# Altium footprint library Ultrascale_PcbLib.PcbLib: 132 footprints (part 4 of 9)
Each footprint in its own frame and in the unit in brackets; x right, y up, seen from the top. Pads: shape width x height; smd on the part's side, far side on the other; paste and mask are expansions set on the pad; w line width, h text height; cw(c..) or ccw(c..) is an arc to the next point about the centre after c.
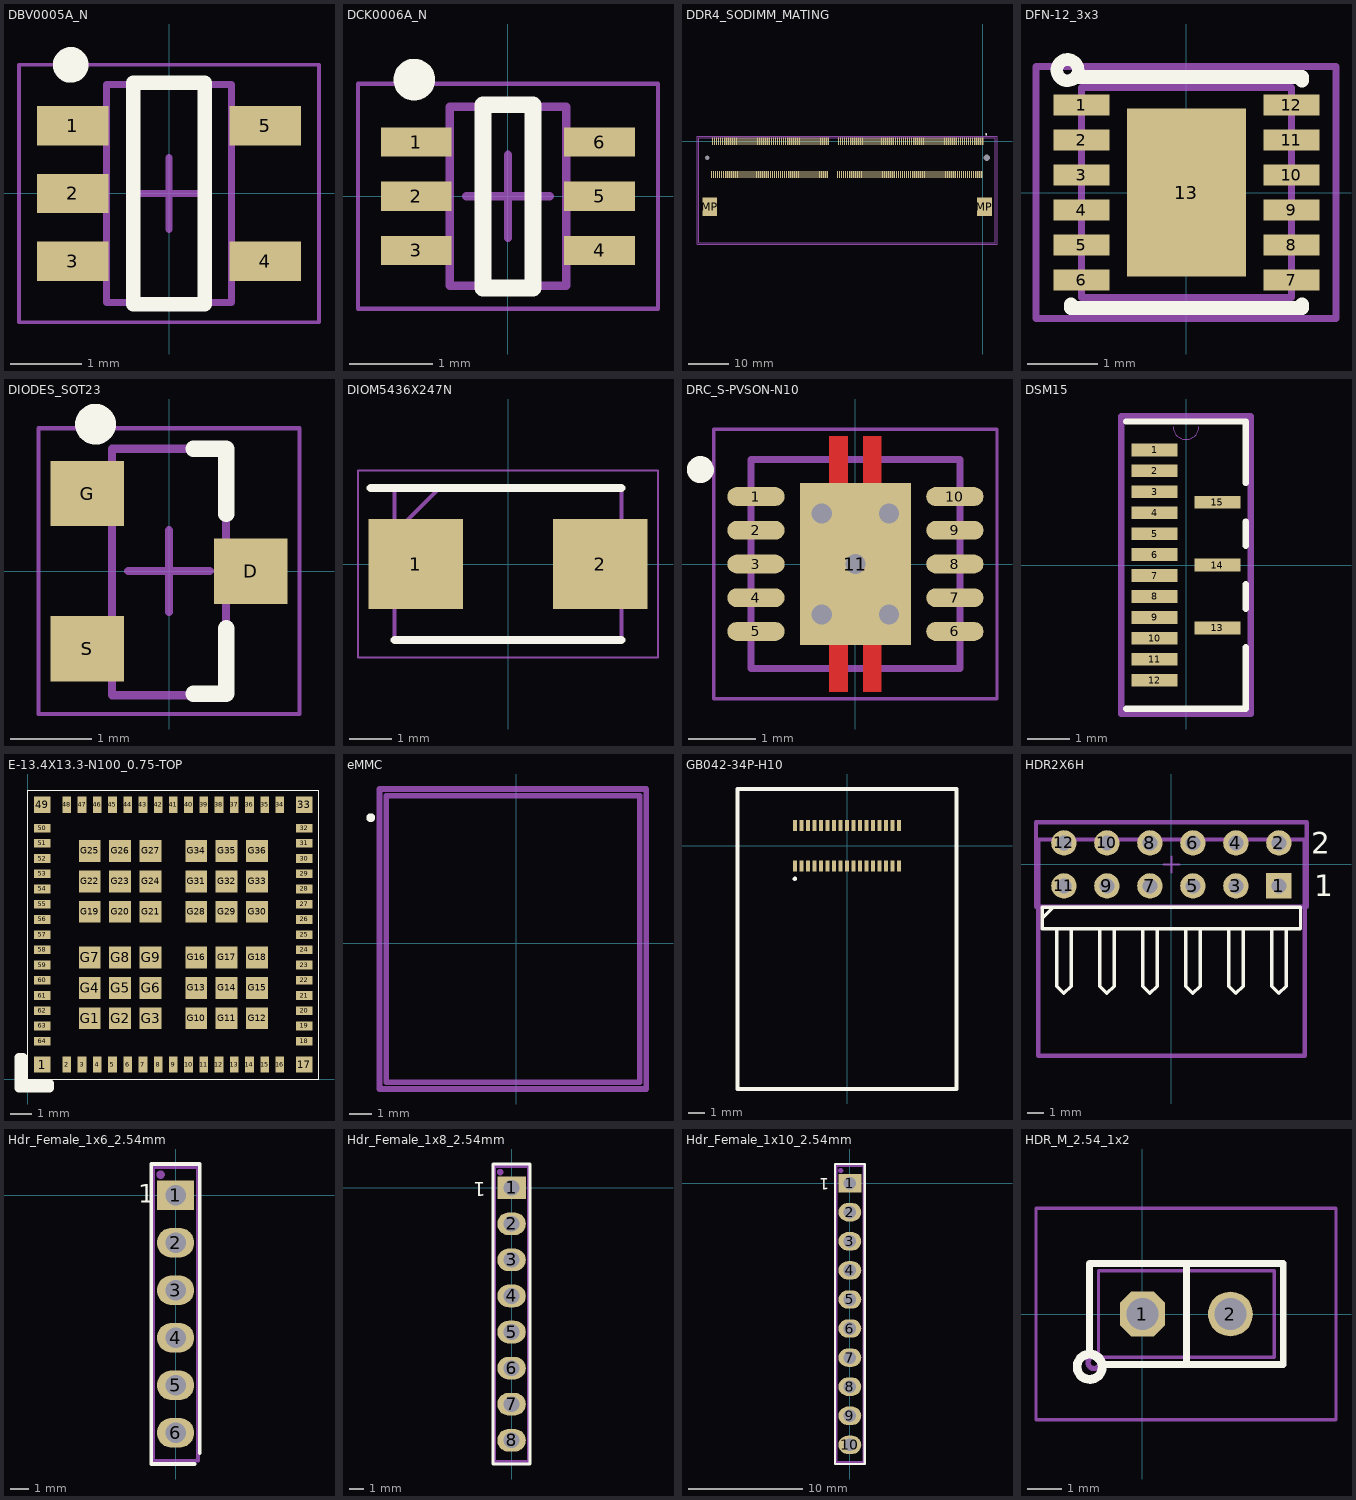
[diagram p3: the footprints below, top view; thin cyan lines are the x and y axes]

## DBV0005A_N [mm] "SOT23, 5-Leads, Body 3.05x1.75mm, Pitch 0.95mm, IPC Medium Density"
height 1.45
pads (5):
  rect 1x0.55 smd: 1(-1.35,0.95) 2(-1.35,0) 3(-1.35,-0.95) 4(1.35,-0.95) 5(1.35,0.95)
Top Overlay:
  circle w0.25: c-1.375,1.8 r0.125
  lines w0.2: -0.5,-1.55 0.5,-1.55 0.5,1.55 -0.5,1.55 -0.5,-1.55
Mechanical 13:
  lines w0.1: -0.875,-1.525 -0.875,1.525 0.875,1.525 0.875,-1.525 -0.875,-1.525
Mechanical 15:
  lines w0.05: -2.1,-1.8 -2.1,1.8 2.1,1.8 2.1,-1.8 -2.1,-1.8
  lines w0.1: -0.5,0 0.5,0 ; 0,-0.5 0,0.5
3D body "DBV0005AaksMF05A.stp": height 1.45, standoff -0.01, extent -1.422,-1.461 1.422,1.46

## DCK0006A_N [mm] "SOT23, 6-Leads, Body 2.15x1.4mm, Pitch 0.65mm, IPC Medium Density"
height 1.1
pads (6):
  rect 0.85x0.35 smd mask+0.05: 1(-1.1,0.65) 2(-1.1,0) 3(-1.1,-0.65) 4(1.1,-0.65) 5(1.1,0) 6(1.1,0.65)
Top Overlay:
  circle w0.25: c-1.125,1.4 r0.125
  lines w0.2: -0.3,-1.1 -0.3,1.1 0.3,1.1 0.3,-1.1 -0.3,-1.1
Mechanical 13:
  lines w0.1: -0.7,-1.075 0.7,-1.075 0.7,1.075 -0.7,1.075 -0.7,-1.075
Mechanical 15:
  lines w0.05: -1.8,-1.35 1.8,-1.35 1.8,1.35 -1.8,1.35 -1.8,-1.35
  lines w0.1: -0.5,0 0.5,0 ; 0,-0.5 0,0.5
3D body "DCK0006AakaMAA06.stp": height 1.1, standoff -0.01, extent -1.14,-1 1.14,1

## DDR4_SODIMM_MATING [mm] "REF: TE 2309409-4"
height 5.35
pads (264):
  rect 0.3x1.75 smd paste+0.05 mask+0.05: 1(0,0) 2(-0.25,-8.2) 3(-0.5,0) 4(-0.75,-8.2) 5(-1,0) 6(-1.25,-8.2) 7(-1.5,0) 8(-1.75,-8.2) 9(-2,0) 10(-2.25,-8.2) 11(-2.5,0) 12(-2.75,-8.2) 13(-3,0) 14(-3.25,-8.2) 15(-3.5,0) 16(-3.75,-8.2) 17(-4,0) 18(-4.25,-8.2) 19(-4.5,0) 20(-4.75,-8.2) 21(-5,0) 22(-5.25,-8.2) 23(-5.5,0) 24(-5.75,-8.2) 25(-6,0) 26(-6.25,-8.2) 27(-6.5,0) 28(-6.75,-8.2) 29(-7,0) 30(-7.25,-8.2) 31(-7.5,0) 32(-7.75,-8.2) 33(-8,0) 34(-8.25,-8.2) 35(-8.5,0) 36(-8.75,-8.2) 37(-9,0) 38(-9.25,-8.2) 39(-9.5,0) 40(-9.75,-8.2) 41(-10,0) 42(-10.25,-8.2) 43(-10.5,0) 44(-10.75,-8.2) 45(-11,0) 46(-11.25,-8.2) 47(-11.5,0) 48(-11.75,-8.2) 49(-12,0) 50(-12.25,-8.2) 51(-12.5,0) 52(-12.75,-8.2) 53(-13,0) 54(-13.25,-8.2) 55(-13.5,0) 56(-13.75,-8.2) 57(-14,0) 58(-14.25,-8.2) 59(-14.5,0) 60(-14.75,-8.2) 61(-15,0) 62(-15.25,-8.2) 63(-15.5,0) 64(-15.75,-8.2) 65(-16,0) 66(-16.25,-8.2) 67(-16.5,0) 68(-16.75,-8.2) 69(-17,0) 70(-17.25,-8.2) 71(-17.5,0) 72(-17.75,-8.2) 73(-18,0) 74(-18.25,-8.2) 75(-18.5,0) 76(-18.75,-8.2) 77(-19,0) 78(-19.25,-8.2) 79(-19.5,0) 80(-19.75,-8.2) 81(-20,0) 82(-20.25,-8.2) 83(-20.5,0) 84(-20.75,-8.2) 85(-21,0) 86(-21.25,-8.2) 87(-21.5,0) 88(-21.75,-8.2) 89(-22,0) 90(-22.25,-8.2) 91(-22.5,0) 92(-22.75,-8.2) 93(-23,0) 94(-23.25,-8.2) 95(-23.5,0) 96(-23.75,-8.2) 97(-24,0) 98(-24.25,-8.2) 99(-24.5,0) 100(-24.75,-8.2) 101(-25,0) 102(-25.25,-8.2) 103(-25.5,0) 104(-25.75,-8.2) 105(-26,0) 106(-26.25,-8.2) 107(-26.5,0) 108(-26.75,-8.2) 109(-27,0) 110(-27.25,-8.2) 111(-27.5,0) 112(-27.75,-8.2) 113(-28,0) 114(-28.25,-8.2) 115(-28.5,0) 116(-28.75,-8.2) 117(-29,0) 118(-29.25,-8.2) 119(-29.5,0) 120(-29.75,-8.2) 121(-30,0) 122(-30.25,-8.2) 123(-30.5,0) 124(-30.75,-8.2) 125(-31,0) 126(-31.25,-8.2) 127(-31.5,0) 128(-31.75,-8.2) 129(-32,0) 130(-32.25,-8.2) 131(-32.5,0) 132(-32.75,-8.2) 133(-33,0) 134(-33.25,-8.2) 135(-33.5,0) 136(-33.75,-8.2) 137(-34,0) 138(-34.25,-8.2) 139(-34.5,0) 140(-34.75,-8.2) 141(-35,0) 142(-35.25,-8.2) 143(-35.5,0) 144(-35.75,-8.2) 145(-38,0) 146(-38.25,-8.2) 147(-38.5,0) 148(-38.75,-8.2) 149(-39,0) 150(-39.25,-8.2) 151(-39.5,0) 152(-39.75,-8.2) 153(-40,0) 154(-40.25,-8.2) 155(-40.5,0) 156(-40.75,-8.2) 157(-41,0) 158(-41.25,-8.2) 159(-41.5,0) 160(-41.75,-8.2) 161(-42,0) 162(-42.25,-8.2) 163(-42.5,0) 164(-42.75,-8.2) 165(-43,0) 166(-43.25,-8.2) 167(-43.5,0) 168(-43.75,-8.2) 169(-44,0) 170(-44.25,-8.2) 171(-44.5,0) 172(-44.75,-8.2) 173(-45,0) 174(-45.25,-8.2) 175(-45.5,0) 176(-45.75,-8.2) 177(-46,0) 178(-46.25,-8.2) 179(-46.5,0) 180(-46.75,-8.2) 181(-47,0) 182(-47.25,-8.2) 183(-47.5,0) 184(-47.75,-8.2) 185(-48,0) 186(-48.25,-8.2) 187(-48.5,0) 188(-48.75,-8.2) 189(-49,0) 190(-49.25,-8.2) 191(-49.5,0) 192(-49.75,-8.2) 193(-50,0) 194(-50.25,-8.2) 195(-50.5,0) 196(-50.75,-8.2) 197(-51,0) 198(-51.25,-8.2) 199(-51.5,0) 200(-51.75,-8.2) 201(-52,0) 202(-52.25,-8.2) 203(-52.5,0) 204(-52.75,-8.2) 205(-53,0) 206(-53.25,-8.2) 207(-53.5,0) 208(-53.75,-8.2) 209(-54,0) 210(-54.25,-8.2) 211(-54.5,0) 212(-54.75,-8.2) 213(-55,0) 214(-55.25,-8.2) 215(-55.5,0) 216(-55.75,-8.2) 217(-56,0) 218(-56.25,-8.2) 219(-56.5,0) 220(-56.75,-8.2) 221(-57,0) 222(-57.25,-8.2) 223(-57.5,0) 224(-57.75,-8.2) 225(-58,0) 226(-58.25,-8.2) 227(-58.5,0) 228(-58.75,-8.2) 229(-59,0) 230(-59.25,-8.2) 231(-59.5,0) 232(-59.75,-8.2) 233(-60,0) 234(-60.25,-8.2) 235(-60.5,0) 236(-60.75,-8.2) 237(-61,0) 238(-61.25,-8.2) 239(-61.5,0) 240(-61.75,-8.2) 241(-62,0) 242(-62.25,-8.2) 243(-62.5,0) 244(-62.75,-8.2) 245(-63,0) 246(-63.25,-8.2) 247(-63.5,0) 248(-63.75,-8.2) 249(-64,0) 250(-64.25,-8.2) 251(-64.5,0) 252(-64.75,-8.2) 253(-65,0) 254(-65.25,-8.2) 255(-65.5,0) 256(-65.75,-8.2) 257(-66,0) 258(-66.25,-8.2) 259(-66.5,0) 260(-66.75,-8.2)
  round 0 hole 1.1 unplated paste+0.05 mask+1.15: MH(-67.775,-4.1)
  round 0 hole 1.6 unplated paste+0.05 mask+1.65: MH(1.025,-4.1)
  rect 3.6x4.5 smd paste+0.05 mask+0.05: MP(-67.175,-16.1) MP(0.425,-16.1)
Top Overlay:
  circle w0.25: c0.8,1.7 r0.125
Mechanical 13:
  lines w0.254: -69.9,-24.95 -69.9,0.9 3.1,0.9 3.1,-24.95 -69.9,-24.95
Mechanical 15:
  lines w0.254: -70.3,-25.3 -70.3,1.3 3.5,1.3 3.5,-25.3 -70.3,-25.3
3D body "c-2309409-4-1-3d.stp": height 5.37, standoff -0.18, extent -69.9,-24.95 3.1,0.9

## DFN-12_3x3 [mm] "DFN, 12 Leads, Body 3.0x3.0mm (max), Pitch 0.50mm, IPC Medium Density"
height 0.85
pads (13):
  rect 0.8x0.3 smd mask+0.051: 1(-1.5,1.25) 2(-1.5,0.75) 3(-1.5,0.25) 4(-1.5,-0.25) 5(-1.5,-0.75) 6(-1.5,-1.25) 7(1.5,-1.25) 8(1.5,-0.75) 9(1.5,-0.25) 10(1.5,0.25) 11(1.5,0.75) 12(1.5,1.25)
  rect 1.7x2.4 smd paste-0.85 mask+0.051: 13(0,0)
Top Overlay:
  circle w0.178: c-1.7,1.75 r0.152
  lines w0.2: -1.65,-1.6 -1.65,-1.65 1.65,-1.65 1.65,-1.6 ; -1.55,1.65 1.65,1.65 1.65,1.6
Top Paste:
  rectangle: -0.825,0.075 -0.075,1.175
  region: 0.825,-0.075 0.075,-0.075 0.075,-1.175 0.825,-1.175
  region: -0.075,-0.075 -0.825,-0.075 -0.825,-1.175 -0.075,-1.175
  rectangle: 0.075,0.075 0.825,1.175
Mechanical 11:
  lines w0.1: -1.5,-1.5 1.5,-1.5 1.5,1.5 -1.5,1.5 -1.5,-1.5
  text "1" at -1.27,1.143 h1
Mechanical 13:
  lines w0.01: -1.52,-1.52 1.52,-1.52 1.52,1.52 -1.52,1.52 -1.52,-1.52
Mechanical 15:
  lines w0.1: -0.5,0 0.5,0 ; 0,-0.5 0,0.5 ; -2.15,-1.8 -2.15,1.8 2.136,1.8 2.136,-1.8 -2.15,-1.8
3D body: height 0.2, standoff 0, extent -1.52,-1.375 -1.225,-1.125
3D body: height 0.2, standoff 0, extent -1.35,-1.375 -1.1,-1.125
3D body: height 0.2, standoff 0, extent -1.52,-0.875 -1.225,-0.625
3D body: height 0.2, standoff 0, extent -1.35,-0.875 -1.1,-0.625
3D body: height 0.2, standoff 0, extent -1.52,-0.375 -1.225,-0.125
3D body: height 0.2, standoff 0, extent -1.35,-0.375 -1.1,-0.125
3D body: height 0.2, standoff 0, extent -1.52,0.125 -1.225,0.375
3D body: height 0.2, standoff 0, extent -1.35,0.125 -1.1,0.375
3D body: height 0.2, standoff 0, extent -1.52,0.625 -1.225,0.875
3D body: height 0.2, standoff 0, extent -1.35,0.625 -1.1,0.875
3D body: height 0.2, standoff 0, extent -1.52,1.125 -1.225,1.375
3D body: height 0.2, standoff 0, extent -1.35,1.125 -1.1,1.375
3D body: height 0.2, standoff 0, extent -0.85,-1.2 0.85,1.2
3D body: height 0.9, standoff 0.02, extent -1.5,-1.5 1.5,1.5
3D body: height 0.91, standoff 0.89, extent -1.35,0.85 -0.85,1.35
3D body: height 0.2, standoff 0, extent 1.1,-1.375 1.35,-1.125
3D body: height 0.2, standoff 0, extent 1.225,-1.375 1.52,-1.125
3D body: height 0.2, standoff 0, extent 1.1,-0.875 1.35,-0.625
3D body: height 0.2, standoff 0, extent 1.225,-0.875 1.52,-0.625
3D body: height 0.2, standoff 0, extent 1.1,-0.375 1.35,-0.125
3D body: height 0.2, standoff 0, extent 1.225,-0.375 1.52,-0.125
3D body: height 0.2, standoff 0, extent 1.1,0.125 1.35,0.375
3D body: height 0.2, standoff 0, extent 1.225,0.125 1.52,0.375
3D body: height 0.2, standoff 0, extent 1.1,0.625 1.35,0.875
3D body: height 0.2, standoff 0, extent 1.225,0.625 1.52,0.875
3D body: height 0.2, standoff 0, extent 1.1,1.125 1.35,1.375
3D body: height 0.2, standoff 0, extent 1.225,1.125 1.52,1.375

## DIODES_SOT23 [mm] "SOT23, 3-Leads, Body 2.9x1.3 mm, Pitch 0.95 mm"
height 1.1
pads (3):
  rect 0.9x0.8 smd mask+0.05: D(1,0) G(-1,0.95) S(-1,-0.95)
Top Overlay:
  circle w0.25: c-0.9,1.8 r0.125
  lines w0.2: 0.3,-1.5 0.7,-1.5 0.7,-0.7 ; 0.3,1.5 0.7,1.5 0.7,0.7
Mechanical 13:
  lines w0.1: -0.7,-1.52 -0.7,1.5 0.7,1.5 0.7,-1.52 -0.7,-1.52
Mechanical 15:
  lines w0.05: -1.6,-1.75 -1.6,1.75 1.6,1.75 1.6,-1.75 -1.6,-1.75
  lines w0.1: -0.5,0 0.5,0 ; 0,-0.5 0,0.5
3D body "DBZ0003A.stp": height 1, standoff 0, extent -1.27,-1.46 1.27,1.46

## DIOM5436X247N [mm] "DIODE SCHOTTKY 40V 2A SMB"
pads (2):
  rect 2.25x2.15 smd: 1(-2.2,0) 2(2.2,0)
Top Overlay:
  lines w0.2: -3.275,1.812 2.702,1.812 ; -2.702,-1.812 2.702,-1.812
Mechanical 15:
  lines w0.1: -2.702,0.738 -1.628,1.812 ; -2.702,-1.812 2.702,-1.812 2.702,1.812 -2.702,1.812 -2.702,-1.812
Mechanical 20:
  lines w0.05: -3.575,-2.225 3.575,-2.225 3.575,2.225 -3.575,2.225 -3.575,-2.225

## DRC_S-PVSON-N10 [mm] "TI 3mmx3mm DRC S-PVSON-N10 Package"
height 1
pads (11):
  oval 0.85x0.28 smd paste-0.025 mask+0.07: 1(-1.475,1) 2(-1.475,0.5) 3(-1.475,0) 4(-1.475,-0.5) 5(-1.475,-1) 6(1.475,-1) 7(1.475,-0.5) 8(1.475,0) 9(1.475,0.5) 10(1.475,1)
  rect 1.65x2.4 smd paste-5 mask+0.05: 11(0,0)
via -0.5,0.75 diameter 0.5 hole 0.3
via 0.5,0.75 diameter 0.5 hole 0.3
via 0.5,-0.75 diameter 0.5 hole 0.3
via -0.5,-0.75 diameter 0.5 hole 0.3
via 0,0 diameter 0.5 hole 0.3
Top Layer:
  region: 0.39,1.9 0.11,1.9 0.11,-1.9 0.39,-1.9
  rectangle: -0.39,-1.9 -0.11,1.9
Top Overlay:
  lines w0.3: -2.265,1.435 ccw(c-2.3,1.4) -2.25,1.4
Top Paste:
  rectangle: -0.79,-1.16 -0.11,-0.11
  region: 0.79,-0.11 0.11,-0.11 0.11,-1.16 0.79,-1.16
  region: 0.79,1.16 0.11,1.16 0.11,0.11 0.79,0.11
  rectangle: -0.79,0.11 -0.11,1.16
  rectangle: -0.38,1.38 -0.12,1.88
  region: 0.38,1.88 0.12,1.88 0.12,1.38 0.38,1.38
  region: 0.38,-1.38 0.12,-1.38 0.12,-1.88 0.38,-1.88
  rectangle: -0.38,-1.88 -0.12,-1.38
Top Solder:
  rectangle: -0.44,-1.95 -0.06,1.95
  region: 0.44,1.95 0.06,1.95 0.06,-1.95 0.44,-1.95
Mechanical 13:
  lines w0.1: -1.55,-1.55 -1.55,1.55 1.55,1.55 1.55,-1.55 -1.55,-1.55
Mechanical 15:
  lines w0.05: -2.1,-2 -2.1,2 2.1,2 2.1,-2 -2.1,-2
  lines w0.1: -0.5,0 0.5,0 ; 0,-0.5 0,0.5
3D body: height 1, standoff 0, extent -1.55,-1.55 1.55,1.55
3D body: height 1.01, standoff 1, extent -1.15,0.85 -0.85,1.15

## DSM15 [mil] "TVS DIODE 5.5VWM 15SON"
pads (15):
  rect 43x12 smd: 1(-29.53,108.27) 2(-29.53,88.58) 3(-29.53,68.9) 4(-29.53,49.21) 5(-29.53,29.53) 6(-29.53,9.84) 7(-29.53,-9.84) 8(-29.53,-29.53) 9(-29.53,-49.21) 10(-29.53,-68.9) 11(-29.53,-88.58) 12(-29.53,-108.27) 13(29.53,-59.06) 14(29.53,0) 15(29.53,59.06)
Top Overlay:
  lines w6: -56,-135 56,-135 56,-77.17 ; -56,135 56,135 56,77.17 ; 56,-40.94 56,-18.12 ; 56,18.12 56,40.94
Mechanical 13:
  lines w0: -12,130 ccw(c0,130) 12,130
Mechanical 15:
  lines w6: -61,-120.11 -61.03,-120.11 -61.03,120.11 -61,120.11 ; 61,-90.58 61.03,-90.58 61.03,90.58 61,90.58 ; -61,-140 61,-140 61,0 61,140 -61,140 -61,0 -61,-140
3D body "DSM15.step": height 31.1, standoff 0, extent -50.98,-164.24 50.99,164.26
3D body: height 10, standoff 0, extent 0,0 10,10

## E-13.4X13.3-N100_0.75-TOP [mm]
pads (100):
  rect 0.75x0.75 smd mask+0.03: 1(0.675,0.675) 17(12.725,0.675) 33(12.725,12.625) 49(0.675,12.625)
  rect 0.4x0.75 smd mask+0.03: 2(1.8,0.675) 3(2.5,0.675) 4(3.2,0.675) 5(3.9,0.675) 6(4.6,0.675) 7(5.3,0.675) 8(6,0.675) 9(6.7,0.675) 10(7.4,0.675) 11(8.1,0.675) 12(8.8,0.675) 13(9.5,0.675) 14(10.2,0.675) 15(10.9,0.675) 16(11.6,0.675) 34(11.6,12.625) 35(10.9,12.625) 36(10.2,12.625) 37(9.5,12.625) 38(8.8,12.625) 39(8.1,12.625) 40(7.4,12.625) 41(6.7,12.625) 42(6,12.625) 43(5.3,12.625) 44(4.6,12.625) 45(3.9,12.625) 46(3.2,12.625) 47(2.5,12.625) 48(1.8,12.625)
  rect 0.75x0.4 smd mask+0.03: 18(12.725,1.75) 19(12.725,2.45) 20(12.725,3.15) 21(12.725,3.85) 22(12.725,4.55) 23(12.725,5.25) 24(12.725,5.95) 25(12.725,6.65) 26(12.725,7.35) 27(12.725,8.05) 28(12.725,8.75) 29(12.725,9.45) 30(12.725,10.15) 31(12.725,10.85) 32(12.725,11.55) 50(0.675,11.55) 51(0.675,10.85) 52(0.675,10.15) 53(0.675,9.45) 54(0.675,8.75) 55(0.675,8.05) 56(0.675,7.35) 57(0.675,6.65) 58(0.675,5.95) 59(0.675,5.25) 60(0.675,4.55) 61(0.675,3.85) 62(0.675,3.15) 63(0.675,2.45) 64(0.675,1.75)
  rect 1x1 smd mask+0.03: G1(2.85,2.8) G2(4.25,2.8) G3(5.65,2.8) G4(2.85,4.2) G5(4.25,4.2) G6(5.65,4.2) G7(2.85,5.6) G8(4.25,5.6) G9(5.65,5.6) G10(7.75,2.8) G11(9.15,2.8) G12(10.55,2.8) G13(7.75,4.2) G14(9.15,4.2) G15(10.55,4.2) G16(7.75,5.6) G17(9.15,5.6) G18(10.55,5.6) G19(2.85,7.7) G20(4.25,7.7) G21(5.65,7.7) G22(2.85,9.1) G23(4.25,9.1) G24(5.65,9.1) G25(2.85,10.5) G26(4.25,10.5) G27(5.65,10.5) G28(7.75,7.7) G29(9.15,7.7) G30(10.55,7.7) G31(7.75,9.1) G32(9.15,9.1) G33(10.55,9.1) G34(7.75,10.5) G35(9.15,10.5) G36(10.55,10.5)
Top Overlay:
  lines w0.05: 0,0 13.4,0 13.4,13.3 0,13.3 0,0
  lines w0.4: -0.4,-0.4 1,-0.4 1,-0.2 -0.2,-0.2 -0.2,1 -0.4,1 -0.4,-0.4
3D body: height 2, standoff 0, extent 0,0 13.335,13.335
3D body: height 2.1, standoff 0, extent 0.97,0.97 1.57,1.57

## eMMC [mm] "VFBGA 153 ball 11.5x13mm Micron"
height 1
Top Overlay:
  lines w0.3: -6.565,5.735 ccw(c-6.6,5.7) -6.55,5.7
Mechanical 13:
  lines w0.254: -5.9,-6.3 -5.9,6.7 5.6,6.7 5.6,-6.3 -5.9,-6.3
Mechanical 15:
  lines w0.254: -6.2,-6.6 -6.2,7 5.9,7 5.9,-6.6 -6.2,-6.6
3D body: height 1.01, standoff 1, extent -5.2,5.4 -4.6,6
3D body: height 1, standoff 0, extent -5.9,-6.3 5.6,6.7

## GB042-34P-H10 [mm]
pads (34):
  rect 0.23x0.7 smd: 1(-3.2,-1.25) 2(-2.8,-1.25) 3(-2.4,-1.25) 4(-2,-1.25) 5(-1.6,-1.25) 6(-1.2,-1.25) 7(-0.8,-1.25) 8(-0.4,-1.25) 9(0,-1.25) 10(0.4,-1.25) 11(0.8,-1.25) 12(1.2,-1.25) 13(1.6,-1.25) 14(2,-1.25) 15(2.4,-1.25) 16(2.8,-1.25) 17(3.2,-1.25) 18(3.2,1.25) 19(2.8,1.25) 20(2.4,1.25) 21(2,1.25) 22(1.6,1.25) 23(1.2,1.25) 24(0.8,1.25) 25(0.4,1.25) 26(0,1.25) 27(-0.4,1.25) 28(-0.8,1.25) 29(-1.2,1.25) 30(-1.6,1.25) 31(-2,1.25) 32(-2.4,1.25) 33(-2.8,1.25) 34(-3.2,1.25)
Top Overlay:
  lines w0.254: -3.225,-2.05 -3.2,-2.025 ; -6.75,-15 -6.75,3.5 6.75,3.5 6.75,-15 -6.75,-15
Mechanical 4:
  lines w0.1: -6.7,-15 6.7,-15 6.7,3.5 -6.7,3.5 -6.7,-15
  text ".Designator" at -1.397,-5.08 h1
3D body: height 5.4, standoff 5, extent -6.25,-13.85 6.325,-1.6
3D body: height 5, standoff 4, extent -6.775,-15.025 6.75,3.525

## HDR2X6H [mm] "Connector; Header; 6x2 Position; Right Angle"
height 4.95
pads (12):
  rect 1.5x1.5 hole 0.9: 1(6.35,-1.27)
  round 1.5 hole 0.9: 2(6.35,1.27) 3(3.81,-1.27) 4(3.81,1.27) 5(1.27,-1.27) 6(1.27,1.27) 7(-1.27,-1.27) 8(-1.27,1.27) 9(-3.81,-1.27) 10(-3.81,1.27) 11(-6.35,-1.27) 12(-6.35,1.27)
Top Overlay:
  lines w0.2: -7.62,-3.175 -6.985,-2.54 ; -6.773,-3.81 -6.773,-7.197 -6.35,-7.62 -5.927,-7.197 -5.927,-3.81 ; -4.233,-3.81 -4.233,-7.197 -3.81,-7.62 -3.387,-7.197 -3.387,-3.81 ; -1.693,-3.81 -1.693,-7.197 -1.27,-7.62 -0.847,-7.197 -0.847,-3.81 ; 0.847,-3.81 0.847,-7.197 1.27,-7.62 1.693,-7.197 1.693,-3.81 ; 3.387,-3.81 3.387,-7.197 3.81,-7.62 4.233,-7.197 4.233,-3.81 ; 5.927,-3.81 5.927,-7.197 6.35,-7.62 6.773,-7.197 6.773,-3.81 ; -7.62,-3.81 7.62,-3.81 7.62,-2.54 -7.62,-2.54 -7.62,-3.81
  text "2" at 8.25,0.63 h1.27
  text "1" at 8.45,-1.87 h1.27
Mechanical 13:
  lines w0.254: -7.874,-11.309 -7.874,1.467 7.874,1.467 7.874,-11.309 -7.874,-11.309
Mechanical 15:
  lines w0.1: -0.475,0 0.475,0 ; 0,-0.475 0,0.475
  lines w0.254: -8,-2.5 -8,2.5 8,2.5 8,-2.5 -8,-2.5
3D body "SSW-106-02-T-D-RA.stp": height 4.98, standoff -2.5, extent -7.874,-11.309 7.874,1.467

## Hdr_Female_1x6_2.54mm [mm] "Creator MM"
pads (6):
  rect 2x1.6 hole 1.1: 1(0,0)
  oval 2x1.6 hole 1.1: 2(0,-2.54) 3(0,-5.08) 4(0,-7.62) 5(0,-10.16) 6(0,-12.7)
Top Overlay:
  lines w0.2: 1.03,-14.37 -1.3,-14.37 -1.3,1.67 1.3,1.67 1.3,-13.8
  text "1" at -2,-0.41 h1
Mechanical 16:
  circle w0.254: c-0.8,1.1 r0.1
  lines w0.2: -1.2,-14.2 1.2,-14.2 1.2,1.5 -1.2,1.5 -1.2,-14.2
Mechanical 29:
  text ".Designator" at -0.74,-5.2 h1.52
3D body "female_header_a-bl254-eg-g06d.stp": height 8.5, standoff -3.2, extent -1.25,-14.095 1.25,1.395

## Hdr_Female_1x8_2.54mm [mm] "Creator MM"
pads (8):
  rect 2x1.6 hole 1.1: 1(0,0)
  oval 2x1.6 hole 1.1: 2(0,-2.54) 3(0,-5.08) 4(0,-7.62) 5(0,-10.16) 6(0,-12.7) 7(0,-15.24) 8(0,-17.78)
Top Overlay:
  lines w0.2: -1.3,-19.45 1.3,-19.45 1.3,1.67 -1.3,1.67 -1.3,-19.45
  text "1" at -1.8,0.4 h1
Mechanical 16:
  circle w0.254: c-0.8,1.1 r0.1
  lines w0.2: -1.2,-19.28 1.2,-19.28 1.2,1.5 -1.2,1.5 -1.2,-19.28
Mechanical 29:
  text ".Designator" at 0.7,-10.3 h1.52
3D body "female_header_a-bl254-eg-g08d.stp": height 8.5, standoff -3.2, extent -1.25,-19.185 1.25,1.385

## Hdr_Female_1x10_2.54mm [mm] "Creator MM"
pads (10):
  rect 2x1.6 hole 1.1: 1(0,0)
  oval 2x1.6 hole 1.1: 2(0,-2.54) 3(0,-5.08) 4(0,-7.62) 5(0,-10.16) 6(0,-12.7) 7(0,-15.24) 8(0,-17.78) 9(0,-20.32) 10(0,-22.86)
Top Overlay:
  lines w0.2: -1.3,-24.53 1.3,-24.53 1.3,1.67 -1.3,1.67 -1.3,-24.53
  text "1" at -1.8,0.444 h1
Mechanical 16:
  circle w0.254: c-0.8,1.1 r0.1
  lines w0.2: -1.2,-24.36 1.2,-24.36 1.2,1.5 -1.2,1.5 -1.2,-24.36
Mechanical 29:
  text ".Designator" at 0.7,-12.7 h1.52
3D body "female_header_a-bl254-eg-g10d.stp": height 8.5, standoff -3.2, extent -1.25,-24.255 1.25,1.395

## HDR_M_2.54_1x2 [mil] "Header Male Vertical 2 Way 2.54mm Pitch"
height 98.43
pads (2):
  oct 51x51 hole 36: 1(0,0)
  round 51 hole 36: 2(100,0)
Top Overlay:
  circle w10: c-60,-60 r14.33
  lines w7.87: 50,-53.94 50,53.94 ; -60,-42.5 -45,-57.5 160,-57.5 160,57.5 -60,57.5 -60,-42.5
Mechanical 11:
  circle w5.91: c-55,-55 r7
  lines w3.94: 50,-49 50,49 ; -50,-49 150,-49 150,49 -50,49 -50,-49
Mechanical 15:
  lines w3.94: -19.68,0 19.68,0 ; 0,-19.68 0,19.68 ; -121.06,-120.08 220,-120.08 220,120.08 -121.06,120.08 -121.06,-120.08
3D body: height 330, standoff 320, extent 95,-12.51 105,-2.5
3D body: height 330, standoff 320, extent 87.5,-5 97.5,5
3D body: height 330, standoff 320, extent 95,2.5 105,12.5
3D body: height 330, standoff 320, extent 102.5,-5 112.5,5
3D body: height 330, standoff 320, extent 95,-5 105,5
3D body: height 25, standoff 0, extent 50,-49 75,49
3D body: height 100, standoff 25, extent 50,-49 150.01,49
3D body: height 25, standoff 0, extent 125,-49 150,49
3D body: height 320, standoff -130, extent 87.5,-12.5 112.5,12.5
3D body: height 330, standoff 320, extent -5,-12.51 5,-2.5
3D body: height 330, standoff 320, extent -12.5,-5 -2.5,5
3D body: height 330, standoff 320, extent -5,2.5 5,12.5
3D body: height 330, standoff 320, extent 2.5,-5 12.5,5
3D body: height 330, standoff 320, extent -5,-5 5,5
3D body: height 25, standoff 0, extent -50,-49 -25,49
3D body: height 100, standoff 25, extent -50,-49 50.01,49
3D body: height 25, standoff 0, extent 25,-49 50,49
3D body: height 320, standoff -130, extent -12.5,-12.5 12.5,12.5